# Altium footprint library lib_protel_HC.PCBLIB: 724 footprints (part 18 of 46)
Each footprint in its own frame and in the unit in brackets; x right, y up, seen from the top. Pads: shape width x height; smd on the part's side, far side on the other; paste and mask are expansions set on the pad; w line width, h text height; cw(c..) or ccw(c..) is an arc to the next point about the centre after c.
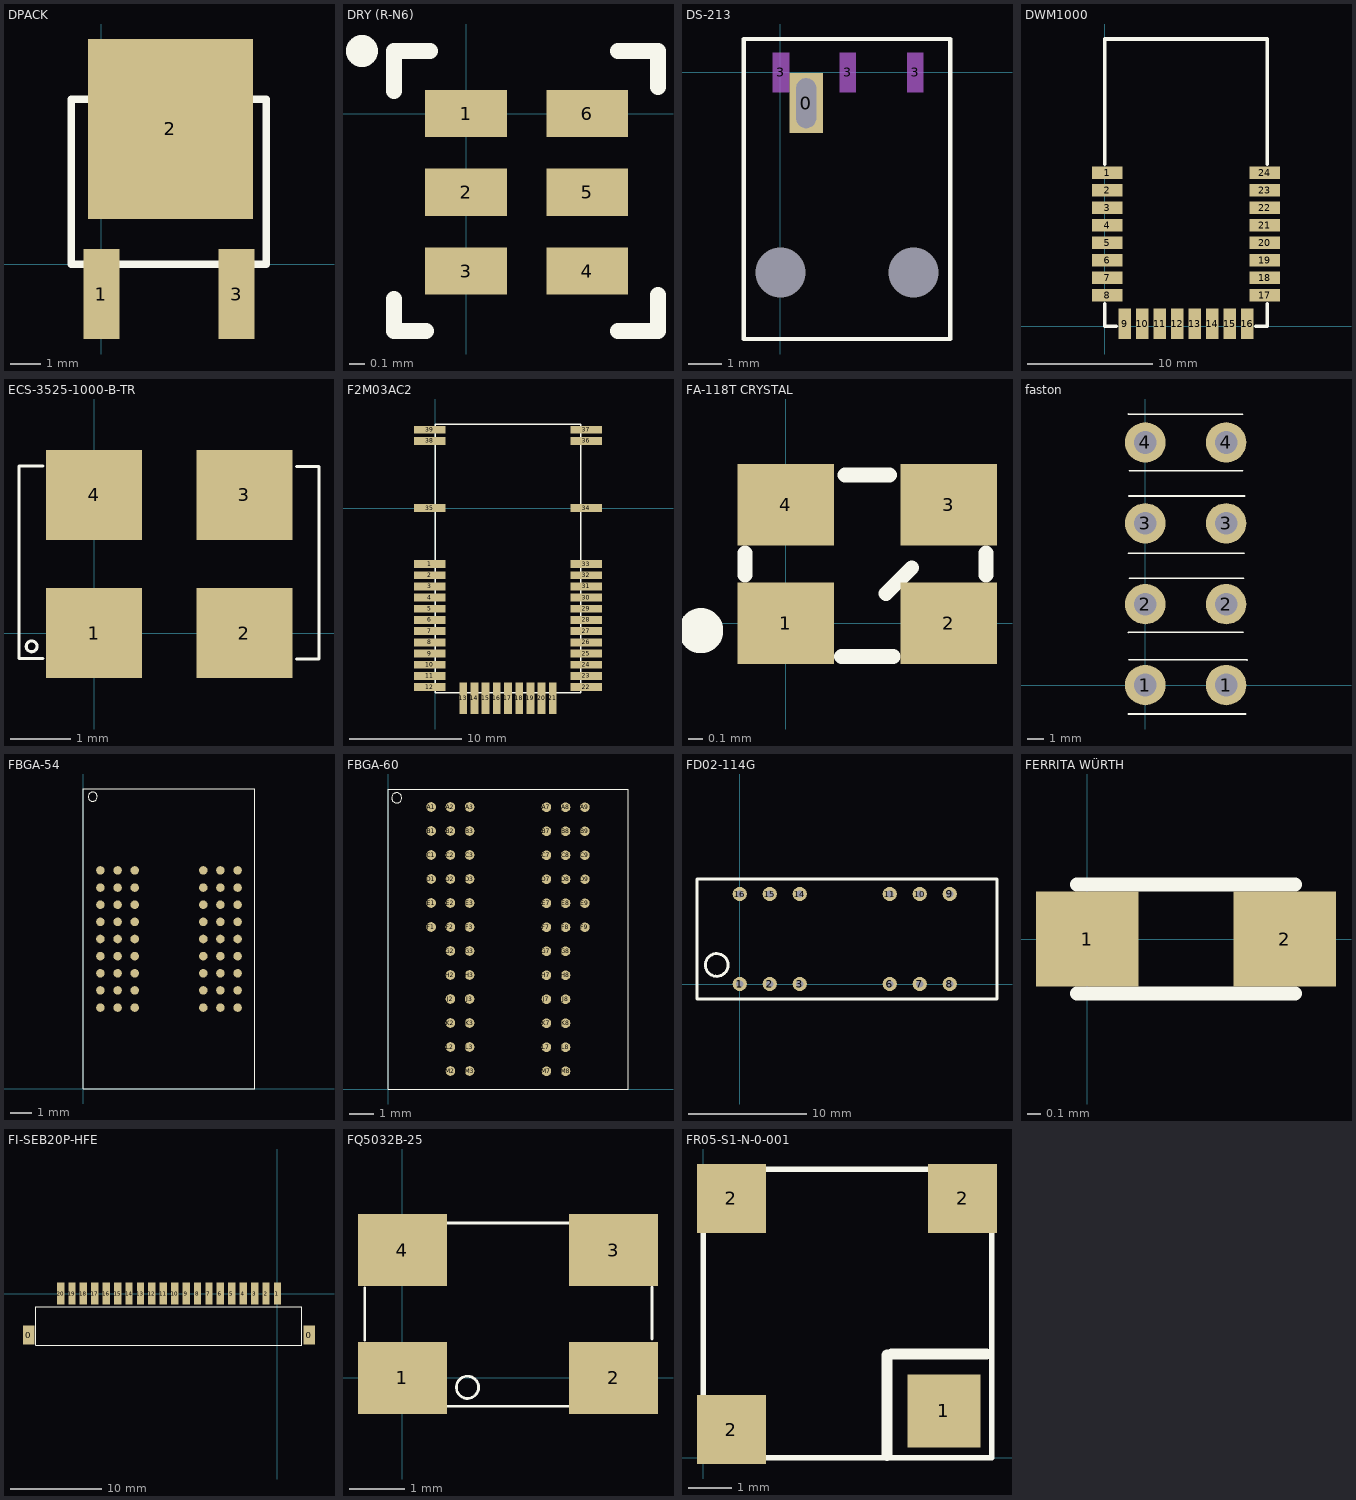
[diagram p17: the footprints below, top view; thin cyan lines are the x and y axes]

## DPACK [mm]
pads (3):
  rect 1.2x3 smd: 1(0,-1) 3(4.5,-1)
  rect 5.5x6 smd: 2(2.3,4.5)
Top Overlay:
  lines w0.25: -1,0 -1,5.5 5.5,5.5 5.5,0 -1,0

## DRY (R-N6) [mm] "TPD4S012"
height 0.6
pads (6):
  rect 0.52x0.3 smd: 1(0,0) 2(0,-0.5) 3(0,-1) 4(0.77,-1) 5(0.77,-0.5) 6(0.77,0)
Top Overlay:
  circle w0.152: c-0.66,0.397 r0.025
  lines w0.1: -0.457,-1.178 -0.457,-1.381 -0.254,-1.381 ; -0.457,0.143 -0.457,0.397 -0.229,0.397 ; 0.965,-1.381 1.219,-1.381 1.219,-1.152 ; 0.965,0.397 1.219,0.397 1.219,0.168

## DS-213 [mm]
height 5
pads (6):
  round 0 hole 1.5: 0(0,-6)
  rect 1x1.8 hole 0.6 slot 1.5 at 90 deg mask+0.1: 0(0.775,-0.925)
  round 0 on Top hole 1.5: 0(4,-6)
  rect 0.5x1.2 on Mech1: 3(0.019,0) 3(2.019,0) 3(4.044,0)
Top Overlay:
  lines w0.127: -1.1,-8 5.1,-8 5.1,1 -1.1,1 -1.1,-8
Multi-Layer:
  lines w0.254: -0.36,-0.635 -0.36,0.635 0.4,0.635 0.4,-0.635 -0.36,-0.635 ; 1.64,-0.635 2.4,-0.635 2.4,0.635 1.64,0.635 1.64,-0.635 ; 3.665,-0.635 4.425,-0.635 4.425,0.635 3.665,0.635 3.665,-0.635

## DWM1000 [mm] "Módulo decawave 1000"
height 4
pads (24):
  rect 2.45x1 smd: 1(0.205,12.3) 2(0.205,10.9) 3(0.205,9.5) 4(0.205,8.1) 5(0.205,6.7) 6(0.205,5.3) 7(0.205,3.9) 8(0.205,2.5) 17(12.795,2.5) 18(12.795,3.9) 19(12.795,5.3) 20(12.795,6.7) 21(12.795,8.1) 22(12.795,9.5) 23(12.795,10.9) 24(12.795,12.3)
  rect 1x2.45 smd: 9(1.6,0.205) 10(3,0.205) 11(4.4,0.205) 12(5.8,0.205) 13(7.2,0.205) 14(8.6,0.205) 15(10,0.205) 16(11.4,0.205)
Top Overlay:
  lines w0.3: 0,1.8 0,0 0.9,0 ; 0,13 0,23 13,23 13,13 ; 12.1,0 13,0 13,1.8
3D body: height 2.1, standoff 1, extent 4,14 9,22
3D body: height 3, standoff 1, extent 0.9,1 12,13
3D body: height 1, standoff 0, extent 0,0 13,23

## ECS-3525-1000-B-TR [mm] "CLOCK ECS-3525-1000-B-TR"
height 1.3
pads (4):
  rect 1.6x1.5 smd: 1(0,0) 2(2.5,0) 3(2.5,2.3) 4(0,2.3)
Top Overlay:
  circle w0.051: c-1.04,-0.22 r0.09
  lines w0.051: -0.85,-0.42 -1.25,-0.42 -1.25,2.78 -0.85,2.78 ; 3.37,-0.43 3.74,-0.43 3.74,2.77 3.37,2.77

## Electrodo [mm] "Prueba"

## F2M03AC2 [mm] "modulo bluetooth free2move"
pads (39):
  rect 2.8x0.7 smd: 1(-0.5,-5) 2(-0.5,-6) 3(-0.5,-7) 4(-0.5,-8) 5(-0.5,-9) 6(-0.5,-10) 7(-0.5,-11) 8(-0.5,-12) 9(-0.5,-13) 10(-0.5,-14) 11(-0.5,-15) 12(-0.5,-16) 22(13.5,-16) 23(13.5,-15) 24(13.5,-14) 25(13.5,-13) 26(13.5,-12) 27(13.5,-11) 28(13.5,-10) 29(13.5,-9) 30(13.5,-8) 31(13.5,-7) 32(13.5,-6) 33(13.5,-5) 34(13.5,0) 35(-0.5,0) 36(13.5,6) 37(13.5,7) 38(-0.5,6) 39(-0.5,7)
  rect 0.7x2.8 smd: 13(2.5,-17) 14(3.5,-17) 15(4.5,-17) 16(5.5,-17) 17(6.5,-17) 18(7.5,-17) 19(8.5,-17) 20(9.5,-17) 21(10.5,-17)
Top Overlay:
  lines w0.127: 0,-16.5 13,-16.5 13,7.5 0,7.5 0,-16.5

## FA-118T CRYSTAL [mm] "CRYSTAL 27,12MHZ"
height 0.35
pads (4):
  rect 0.65x0.55 smd mask+0.05: 1(0,0) 2(1.1,0) 3(1.1,0.8) 4(0,0.8)
Top Overlay:
  circle w0.254: c-0.575,-0.05 r0.025
  lines w0.1: -0.275,0.325 -0.275,0.475 ; 0.375,-0.225 0.725,-0.225 ; 0.4,1 0.7,1 ; 0.675,0.2 0.85,0.375 ; 1.35,0.325 1.35,0.475

## faston [mm]
pads (8):
  round 2.5 hole 1.4: 1(0,0) 1(5,0) 2(0,5) 2(5,5) 3(0,10) 3(5,10) 4(0,15) 4(5,15)
Top Overlay:
  lines w0.1: -1.06,-1.79 6.22,-1.79 ; -1.06,3.25 6.07,3.27 ; -1.06,16.76 6.04,16.75 ; -1.04,8.14 6.12,8.16 ; -1.02,1.56 6.29,1.55 ; -1.02,11.69 6.14,11.69 ; -1,6.61 6.1,6.61 ; -1,13.24 6.01,13.24

## FBGA-54 [mm] "FBGA para MEMORIA SDRAM 256 MICRON"
height 0.65
pads (54):
  round 0.4 smd mask+0.025: A1(0.8,10.2) A2(1.6,10.2) A3(2.4,10.2) A7(5.6,10.2) A8(6.4,10.2) A9(7.2,10.2) B1(0.8,9.4) B2(1.6,9.4) B3(2.4,9.4) B7(5.6,9.4) B8(6.4,9.4) B9(7.2,9.4) C1(0.8,8.6) C2(1.6,8.6) C3(2.4,8.6) C7(5.6,8.6) C8(6.4,8.6) C9(7.2,8.6) D1(0.8,7.8) D2(1.6,7.8) D3(2.4,7.8) D7(5.6,7.8) D8(6.4,7.8) D9(7.2,7.8) E1(0.8,7) E2(1.6,7) E3(2.4,7) E7(5.6,7) E8(6.4,7) E9(7.2,7) F1(0.8,6.2) F2(1.6,6.2) F3(2.4,6.2) F7(5.6,6.2) F8(6.4,6.2) F9(7.2,6.2) G1(0.8,5.4) G2(1.6,5.4) G3(2.4,5.4) G7(5.6,5.4) G8(6.4,5.4) G9(7.2,5.4) H1(0.8,4.6) H2(1.6,4.6) H3(2.4,4.6) H7(5.6,4.6) H8(6.4,4.6) H9(7.2,4.6) J1(0.8,3.8) J2(1.6,3.8) J3(2.4,3.8) J7(5.6,3.8) J8(6.4,3.8) J9(7.2,3.8)
Top Overlay:
  circle w0.051: c0.438,13.64 r0.212
  lines w0.051: 0,0 0,14 8,14 8,0 0,0

## FBGA-60 [mm] "FBGA para MEMORIA SDRAM 512 MICRON"
height 0.85
pads (60):
  round 0.4 smd mask+0.025: A1(1.8,11.75) A2(2.6,11.75) A3(3.4,11.75) A7(6.6,11.74) A8(7.4,11.74) A9(8.2,11.74) B1(1.8,10.75) B2(2.6,10.75) B3(3.4,10.75) B7(6.6,10.74) B8(7.4,10.74) B9(8.2,10.74) C1(1.8,9.75) C2(2.6,9.75) C3(3.4,9.75) C7(6.6,9.74) C8(7.4,9.74) C9(8.2,9.74) D1(1.8,8.75) D2(2.6,8.75) D3(3.4,8.75) D7(6.6,8.74) D8(7.4,8.74) D9(8.2,8.74) E1(1.8,7.75) E2(2.6,7.75) E3(3.4,7.75) E7(6.6,7.74) E8(7.4,7.74) E9(8.2,7.74) F1(1.8,6.75) F2(2.6,6.75) F3(3.4,6.75) F7(6.6,6.74) F8(7.4,6.74) F9(8.2,6.74) G2(2.6,5.75) G3(3.4,5.75) G7(6.6,5.74) G8(7.4,5.74) H2(2.6,4.75) H3(3.4,4.75) H7(6.6,4.74) H8(7.4,4.74) J2(2.6,3.75) J3(3.4,3.75) J7(6.6,3.74) J8(7.4,3.74) K2(2.6,2.75) K3(3.4,2.75) K7(6.6,2.74) K8(7.4,2.74) L2(2.6,1.75) L3(3.4,1.75) L7(6.6,1.74) L8(7.4,1.74) M2(2.6,0.75) M3(3.4,0.75) M7(6.6,0.74) M8(7.4,0.74)
Top Overlay:
  circle w0.051: c0.36,12.13 r0.212
  lines w0.051: 0,0 10,0 10,12.5 0,12.5 0,0

## FD02-114G [mm]
height 6.35
pads (12):
  round 1.2 hole 0.6: 1(0,0) 2(2.54,0) 3(5.08,0) 6(12.7,0) 7(15.24,0) 8(17.78,0) 9(17.78,7.62) 10(15.24,7.62) 11(12.7,7.62) 14(5.08,7.62) 15(2.54,7.62) 16(0,7.62)
Top Overlay:
  circle w0.254: c-1.95,1.61 r0.96
  lines w0.254: -3.62,-1.27 -3.62,8.89 21.78,8.89 21.78,-1.27 -3.62,-1.27

## FERRITA WÜRTH [mm] "FERRITA WÜRTH"
height 0.8
pads (2):
  rect 0.75x0.7 smd: 1(0,0) 2(1.45,0)
Top Overlay:
  lines w0.1: -0.075,-0.4 1.525,-0.4 ; -0.075,0.4 1.525,0.4

## FI-SEB20P-HFE [mm] "CONECTOR LVDS"
height 2
pads (22):
  rect 1.25x2.1 smd: 0(-27.25,-4.55) 0(3.5,-4.55)
  rect 0.8x2.4 smd: 1(0,0) 2(-1.25,0) 3(-2.5,0) 4(-3.75,0) 5(-5,0) 6(-6.25,0) 7(-7.5,0) 8(-8.75,0) 9(-10,0) 10(-11.25,0) 11(-12.5,0) 12(-13.75,0) 13(-15,0) 14(-16.25,0) 15(-17.5,0) 16(-18.75,0) 17(-20,0) 18(-21.25,0) 19(-22.5,0) 20(-23.74,0)
Top Overlay:
  lines w0.127: -26.44,-5.68 -26.44,-1.43 2.66,-1.43 2.66,-5.68 -26.44,-5.68

## FQ5032B-25 [mm] "crystal de 25MHZ SMD"
height 1.2
pads (4):
  rect 1.6x1.3 smd: 1(0,0) 2(3.8,0) 3(3.8,2.3) 4(0,2.3)
Top Overlay:
  circle w0.051: c1.17,-0.17 r0.2
  lines w0.051: -0.68,0.68 -0.68,1.62 ; 0.78,2.79 3.04,2.79 ; 0.79,-0.51 3,-0.51 ; 4.49,0.7 4.49,1.63

## FR05-S1-N-0-001 [mm] "ANTENA FRACTUS CUADRADA ZIGBEE"
height 1
pads (4):
  rect 1.7x1.7 smd: 1(5.588,1.092)
  rect 1.6x1.6 smd: 2(0.66,0.66) 2(0.66,6.02) 2(6.02,6.02)
Top Overlay:
  lines w0.127: 0,0 6.7,0 6.7,6.7 0,6.7 0,0
  lines w0.254: 4.267,0.051 4.267,2.388 ; 4.369,2.413 6.579,2.413